# Altium integrated library Blues Wireless Library.IntLib: 99 symbols (part 2 of 2)
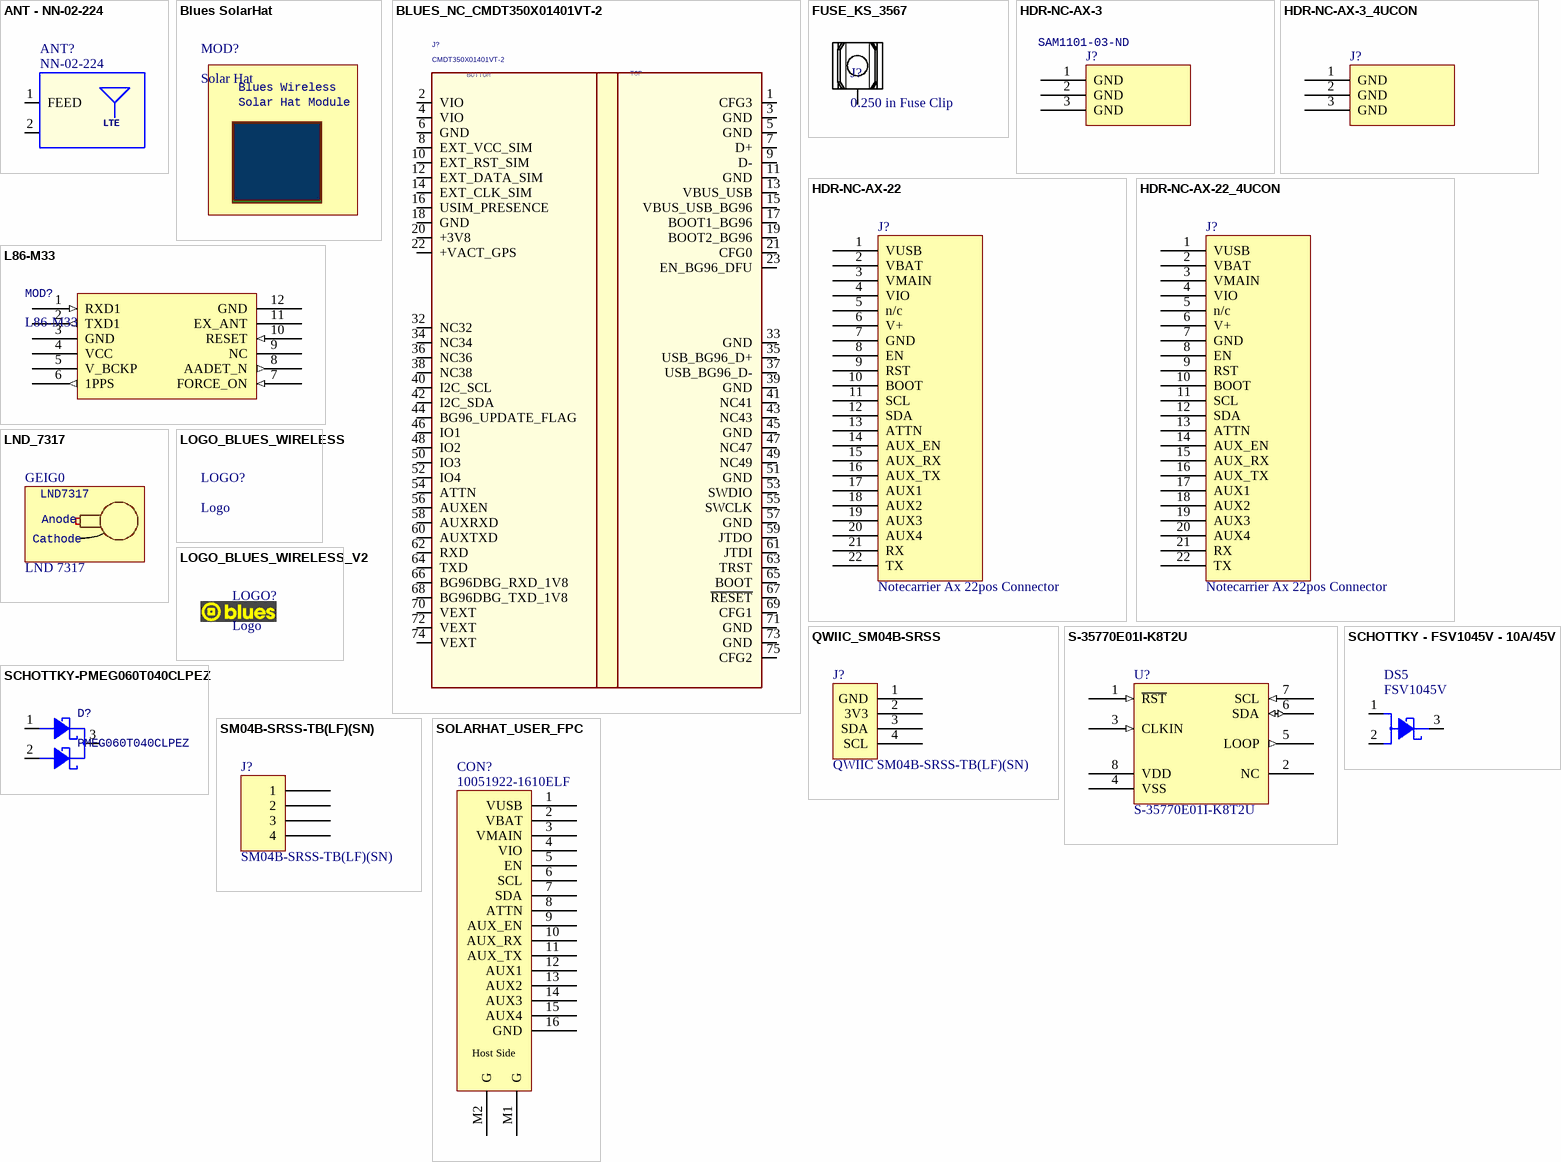
[diagram p8: symbols ANT - NN-02-224 to SOLARHAT_USER_FPC]

## BLUES_NC_CMDT350X01401VT-2
designator J?, comment CMDT350X01401VT-2
CONN. M.2 75P M P=0.5 CMDT350X01401VT-2 AMPHENOL SMT, Pinned for Blues Inc Notecard; Database: 44633; Famiglia: CONNETTORE; Pkg Type: SMD; Temp Range: -40°..+80°; Caratteristiche: 75P; Distributor: FAE; Price Distributor Cad: 1,079
footprint AMP_CMDT350E01401VT-2 (Vertical M.2 Mini PCIe Gen4 Connector, Key E)
footprint BLUES_NC_CMDT350X01401VT-2 (Blues Inc Notecard Slot - Vertical M.2 Mini PCIe Gen4 Connector, Key E)
pins: 1 CFG3, 2 VIO (power), 3 GND (power), 4 VIO (power), 5 GND (power), 6 GND (power), 7 D+, 8 EXT_VCC_SIM, 9 D-, 10 EXT_RST_SIM, 11 GND (power), 12 EXT_DATA_SIM, 13 VBUS_USB (power), 14 EXT_CLK_SIM, 15 VBUS_USB_BG96, 16 USIM_PRESENCE, 17 BOOT1_BG96, 18 GND (power), 19 BOOT2_BG96, 20 +3V8 (power), 21 CFG0, 22 +VACT_GPS, 23 EN_BG96_DFU, 32 NC32, 33 GND (power), 34 NC34, 35 USB_BG96_D+, 36 NC36, 37 USB_BG96_D-, 38 NC38, 39 GND (power), 40 I2C_SCL, 41 NC41, 42 I2C_SDA, 43 NC43, 44 BG96_UPDATE_FLAG, 45 GND (power), 46 IO1, 47 NC47, 48 IO2, 49 NC49, 50 IO3, 51 GND (power), 52 IO4, 53 SWDIO, 54 ATTN, 55 SWCLK, 56 AUXEN, 57 GND (power), 58 AUXRXD, 59 JTDO, 60 AUXTXD, 61 JTDI, 62 RXD, 63 TRST, 64 TXD, 65 BOOT, 66 BG96DBG_RXD_1V8, 67 ~{RESET}, 68 BG96DBG_TXD_1V8, 69 CFG1, 70 VEXT (power), 71 GND (power), 72 VEXT (power), 73 GND (power), 74 VEXT (power), 75 CFG2
text: BOTTOM; TOP

## FUSE_KS_3567
designator J?, comment 0.250 in Fuse Clip
Fuse Clip 0.250 in. SMD, Keystone 3567
footprint FUSE_KS_3567 (Fuse Holder, 1/4 inch, SMD. Keystone 3567)
pins: 1 "Position 1"

## HDR-NC-AX-3
designator J?, comment Notecarrier Ax 3pos Connector  Supplier Part Number 1: SAM1101-03-ND
Header, 3 pos. For connection to Notecarrier Ax.; Number of Contacts: 22; Number of Positions: 3; Gender: Male; Connector Type: Male Pin; Pitch: 0.1inch; Function 1: Function 1; Function 2: Function 2; Manufacturer 2: Samtec; Manufacturer Part Number 2: TLW-103-06-T-S; RoHS: Yes; Category: Connectors; Pricing 2: 1=2.62000, 10=2.51900, 25=2.30880, 50=2.20380, 100=2.09880, 250=1.83644, 500=1.78398 (USD); Mount: Through Hole; Contact Plating: Tin; Color: Black; Housing Color: Black; Contact Material: Bronze; Housing Material: Plastic; Number of Rows: 1; Termination: Solder; Packaging: Bulk; Package Quantity: 1; Series: Flex Stack, TLW; Contact Type: Male Pin; Length: 55.9mm; Width: 2.45mm; Height: 1.52mm; Contact Mating Length: 0.105inch; Radiation Hardening: No; Lead Free: Lead Free; RoHS Compliant: Yes; ComponentLink1URL: https://datasheet.ciiva.com/6882/tlw-mkt-6882597.pdf?src-supplier=Digi-Key; ComponentLink1Description: https://datasheet.ciiva.com/6882/tlw-mkt-6882597.pdf?src-supplier=Digi-Key; Supplier 1: Digi-Key
footprint HDR-NC-AX-3 (Header, 3pos, to Notecarrier AX)
pins: 1 GND "Pin 1", 2 GND "Pin 1", 3 GND "Pin 1"

## HDR-NC-AX-3_4UCON
designator J?, comment Notecarrier Ax 3pos Connector
Header, 3 pos. For connection to Notecarrier Ax.; Manufacturer: 4UCON; Manufacturer Part Number: 00626; Connector Type: Male Pin; Function 1: Function 1; Function 2: Function 2; ComponentLink1Description: Supplier Page; ComponentLink1URL: http://www.4uconnector.com/online/object/4udrawing/00626.pdf; Category: Connectors; Height: 2.5mm; Supplier 1: 4UCON; Supplier Part Number 1: 00626
footprint HDR-NC-AX-3_4UCON (Header, 3pos, to Notecarrier AX, 2.5 mm body)
pins: 1 GND "Pin 1", 2 GND "Pin 1", 3 GND "Pin 1"

## HDR-NC-AX-22
designator J?, comment Notecarrier Ax 22pos Connector
Header, 22 pos. For connection to Notecarrier Ax.; Number of Contacts: 22; Gender: Male; Connector Type: Male Pin; Pitch: 0.1inch; Function 1: Function 1; Function 2: Function 2; Supplier 1: Newark; Supplier 2: Digi-Key; Manufacturer 2: Samtec; Manufacturer Part Number 2: TLW-122-06-T-S; RoHS: Yes; Category: Connectors; Pricing 2: 1=2.62000, 10=2.51900, 25=2.30880, 50=2.20380, 100=2.09880, 250=1.83644, 500=1.78398 (USD); Mount: Through Hole; Contact Plating: Tin; Color: Black; Housing Color: Black; Contact Material: Bronze; Housing Material: Plastic; Number of Rows: 1; Termination: Solder; Packaging: Bulk; Package Quantity: 1; Number of Positions: 22; Series: Flex Stack, TLW; Contact Type: Male Pin; Length: 55.9mm; Width: 2.45mm; Height: 1.52mm; Contact Mating Length: 0.105inch; Radiation Hardening: No; Lead Free: Lead Free; RoHS Compliant: Yes; ComponentLink1URL: https://datasheet.ciiva.com/6882/tlw-mkt-6882597.pdf?src-supplier=Digi-Key; ComponentLink1Description: https://datasheet.ciiva.com/6882/tlw-mkt-6882597.pdf?src-supplier=Digi-Key; Supplier Part Number 2: SAM1101-22-ND; Supplier Part Number 1: 12P0533
footprint HDR-NC-AX-22 (Header, 22 pos, to Notecarrier AX)
pins: 1 VUSB "Pin 1", 2 VBAT "Pin 1", 3 VMAIN "Pin 1", 4 VIO "Pin 1", 5 n/c "Pin 1", 6 V+ "Pin 1", 7 GND "Pin 1", 8 EN "Pin 1", 9 RST "Pin 1", 10 BOOT "Pin 1", 11 SCL "Pin 1", 12 SDA "Pin 1", 13 ATTN "Pin 1", 14 AUX_EN "Pin 1", 15 AUX_RX "Pin 1", 16 AUX_TX "Pin 1", 17 AUX1 "Pin 1", 18 AUX2 "Pin 1", 19 AUX3 "Pin 1", 20 AUX4 "Pin 1", 21 RX "Pin 1", 22 TX "Pin 1"

## HDR-NC-AX-22_4UCON
designator J?, comment Notecarrier Ax 22pos Connector
Header, 22 pos. For connection to Notecarrier Ax.; Manufacturer: 4UCON; Manufacturer Part Number: 22042; Connector Type: Male Pin; Function 1: Function 1; Function 2: Function 2; Category: Connectors; ComponentLink1Description: Datasheet; ComponentLink1URL: http://www.4uconnector.com/online/object/4udrawing/22042.pdf; Height: 2.5mm; Supplier 1: 4UCON; Supplier Part Number 1: 22042
footprint HDR-NC-AX-22_4UCON (Header, 22 pos, to Notecarrier AX, 2.5mm body)
pins: 1 VUSB "Pin 1", 2 VBAT "Pin 1", 3 VMAIN "Pin 1", 4 VIO "Pin 1", 5 n/c "Pin 1", 6 V+ "Pin 1", 7 GND "Pin 1", 8 EN "Pin 1", 9 RST "Pin 1", 10 BOOT "Pin 1", 11 SCL "Pin 1", 12 SDA "Pin 1", 13 ATTN "Pin 1", 14 AUX_EN "Pin 1", 15 AUX_RX "Pin 1", 16 AUX_TX "Pin 1", 17 AUX1 "Pin 1", 18 AUX2 "Pin 1", 19 AUX3 "Pin 1", 20 AUX4 "Pin 1", 21 RX "Pin 1", 22 TX "Pin 1"

## L86-M33
designator MOD?
Global Navigation Satellite System Module with Patch Antenna. Quectel L86-M33; Manufacturer 1: Quectel Wireless Solutions; Supplier 1: Digi-Key; Manufacturer Part Number 1: L86-M33; RoHS: Yes; Category: Connectors; Pricing 1: 1=12.70000, 10=11.49500, 25=10.58760, 100=9.68000 (USD); ComponentLink1URL: http://www.quectel.com/UploadFile/Product/Quectel_L86_GNSS_Specification_V1.0.pdf?src-supplier=Avnet; ComponentLink1Description: http://www.quectel.com/UploadFile/Product/Quectel_L86_GNSS_Specification_V1.0.pdf?src-supplier=Avnet; Supplier Part Number 1: 2958-L86-M33CT-ND
footprint Quectel L86 (Quectel L86 Module)
pins: 1 RXD1 (in), 2 TXD1 (out), 3 GND, 4 VCC, 5 V_BCKP, 6 1PPS (out), 7 FORCE_ON (in), 8 AADET_N (out), 9 NC, 10 RESET (in), 11 EX_ANT, 12 GND

## LND_7317
designator GEIG0, comment LND 7317  (mechanical)
LND 7317 Pancake Geiger Mueller Tube; Manufacturer Part Number: 7317; Lot qty: 1; ComponentLink1Description: Product Page; ComponentLink1URL: http://www.lndinc.com/products/17/; Manufacturer: LND; Supplier 1: LND; Supplier Part Number 1: 7317
footprint lnd7317 (LND7317 GM Tube)
text: LND7317; Anode; Cathode

## LOGO_BLUES_WIRELESS
designator LOGO?, comment Logo  (graphical)
Logo, Blues Wireless
footprint LOGO_BLUES_WIRELESS (Logo Silkscreen)

## LOGO_BLUES_WIRELESS_V2
designator LOGO?, comment Logo  (graphical)
Logo, Blues Wireless
footprint LOGO_BLUES_WIRELESS_v2 (Blues Wireless Box-in-circle Logo)

## QWIIC_SM04B-SRSS
designator J?, comment QWIIC SM04B-SRSS-TB(LF)(SN)
CONN HEADER SH 4POS SIDE 1MM TIN QWIIC pinout; Manufacturer: JST; Number of Positions: 4; Connector Type: Male Pin; Contact Resistance: 40mR; Max Current Rating: 1A; Max Voltage Rating (AC): 50V; Pitch: 0.039inch; Supplier 1: Digi-Key; Manufacturer Part Number: SM04B-SRSS-TB(LF)(SN); RoHS: Yes; Category: Connectors; Pricing 1: 1=0.57000, 10=0.49300, 100=0.40630, 500=0.35328, 1000=0.29146 (USD); Mount: Surface Mount; Contact Material: Copper Alloy; Contact Plating: Tin,Copper; Color: Natural; Housing Color: Beige; Housing Material: Polyamide; Min Operating Temperature: -25°C; Max Operating Temperature: 85°C; Number of Rows: 1; Termination: Solder; Packaging: Tape and Reel; Orientation: Right Angle; Number of Contacts: 4; Max Voltage Rating (DC): 50V; Length: 6mm; Depth: 4.95mm; Lead Free: Lead Free; ComponentLink1URL: https://datasheet.ciiva.com/26894/getdatasheetpartid-640736-26894676.pdf?src-supplier=Verical; ComponentLink1Description: https://datasheet.ciiva.com/26894/getdatasheetpartid-640736-26894676.pdf?src-supplier=Verical; ComponentLink2URL: https://datasheet.ciiva.com/26894/getdatasheetpartid-499363-26894945.pdf?src-supplier=Verical; ComponentLink2Description: https://datasheet.ciiva.com/26894/getdatasheetpartid-499363-26894945.pdf?src-supplier=Verical; ComponentLink3URL: https://datasheet.ciiva.com/16487/jstsm04b-srss-tb-lf-sn-16487222.pdf?src-supplier=Future+Electronics; ComponentLink3Description: https://datasheet.ciiva.com/16487/jstsm04b-srss-tb-lf-sn-16487222.pdf?src-supplier=Future+Electronics; Supplier Part Number 1: 455-1804-1-ND
footprint QWIIC_SM04B-SRSS (QWIIC Connector Pin Order)
pins: 1 GND, 2 3V3, 3 SDA, 4 SCL

## S-35770E01I-K8T2U
designator U?
COUNTER IC WITH 2-WIRE (I2C-bus) INTERFACE, ABLIC S-35770; Manufacturer 1: ABLIC U.S.A.; Supplier 1: Digi-Key; Manufacturer Part Number 1: S-35770E01I-K8T2U; RoHS: No; Stock 1: 3157; Pricing 1: 1=5.86000, 10=5.26300, 25=4.97520, 100=4.31180, 250=4.09064, 500=3.67052, 1000=3.09562 (USD); Supplier Part Number 1: 1662-3409-1-ND; ComponentLink1Description: Datasheet; ComponentLink1URL: https://www.ablic.com/en/doc/datasheet/counter_ic/S35770_I_E.pdf
footprint TSOP65P400X80-8N (TSOP, 8-Leads, Body 2.90x2.80mm, Pitch 0.65mm, IPC Medium Density)
pins: 1 ~{RST} (in) "Reset signal (needs pullup)", 2 NC "No connection", 3 CLKIN (in) "Input pin for external clock", 4 VSS (power) "Ground", 5 LOOP (out) "Counter loop flag", 6 SDA (io) "N-ch open-drain output,", 7 SCL (in) "Serial clock", 8 VDD (power) "Positive power supply"

## SCHOTTKY - FSV1045V - 10A/45V
designator DS5, comment FSV1045V
DIODO SCHOTTKY 10A 45V FSV1045V TO277-3 SMT; Caratteristiche: 10A/45V; Database: 42269; Pkg Type: SMD; Temp Range: -55°..+150°; Distributor: FAE; Famiglia: DIODO; Modello: SCHOTTKY; Price Distributor Cad: 0,629; MPN: FSV1045V; PCB Footprint: TO277-3
footprint TO277-3
pins: 1 A1, 2 A2, 3 C

## SCHOTTKY-PMEG060T040CLPEZ
designator D?, comment PMEG060T040CLPEZ
60 V, 2 x 2 A dual common cathode low leakage current Schottky rectifier; Manufacturer: Nexperia; Supplier 1: Newark; Manufacturer Part Number: PMEG060T040CLPEZ; RoHS: No; Stock 1: 4997; Pricing 1: 1=0.71300, 10=0.58300, 25=0.51500, 50=0.45900, 100=0.39300, 250=0.34500, 500=0.27300, 1000=0.26300 (USD); Supplier 2: Digi-Key; Stock 2: 4917; Pricing 2: 1=0.65000, 10=0.56900, 100=0.43660, 500=0.34514, 1000=0.27611, 2000=0.25023 (USD); Supplier Part Number 2: 1727-PMEG060T040CLPEZCT-ND
footprint NXP_CFP15B (Nexperia CFP15B (SOT1289B))
pins: 1 A1, 2 A2, 3 C

## SM04B-SRSS-TB(LF)(SN)
designator J?
CONN HEADER SH 4POS SIDE 1MM TIN; Manufacturer: JST; Number of Positions: 4; Connector Type: Male Pin; Contact Resistance: 40mR; Max Current Rating: 1A; Max Voltage Rating (AC): 50V; Pitch: 0.039inch; Supplier 1: Digi-Key; Manufacturer Part Number: SM04B-SRSS-TB(LF)(SN); RoHS: Yes; Category: Connectors; Pricing 1: 1=0.57000, 10=0.49300, 100=0.40630, 500=0.35328, 1000=0.29146 (USD); Mount: Surface Mount; Contact Material: Copper Alloy; Contact Plating: Tin,Copper; Color: Natural; Housing Color: Beige; Housing Material: Polyamide; Min Operating Temperature: -25°C; Max Operating Temperature: 85°C; Number of Rows: 1; Termination: Solder; Packaging: Tape and Reel; Orientation: Right Angle; Number of Contacts: 4; Max Voltage Rating (DC): 50V; Length: 6mm; Depth: 4.95mm; Lead Free: Lead Free; ComponentLink1URL: https://datasheet.ciiva.com/26894/getdatasheetpartid-640736-26894676.pdf?src-supplier=Verical; ComponentLink1Description: https://datasheet.ciiva.com/26894/getdatasheetpartid-640736-26894676.pdf?src-supplier=Verical; ComponentLink2URL: https://datasheet.ciiva.com/26894/getdatasheetpartid-499363-26894945.pdf?src-supplier=Verical; ComponentLink2Description: https://datasheet.ciiva.com/26894/getdatasheetpartid-499363-26894945.pdf?src-supplier=Verical; ComponentLink3URL: https://datasheet.ciiva.com/16487/jstsm04b-srss-tb-lf-sn-16487222.pdf?src-supplier=Future+Electronics; ComponentLink3Description: https://datasheet.ciiva.com/16487/jstsm04b-srss-tb-lf-sn-16487222.pdf?src-supplier=Future+Electronics; Supplier Part Number 1: 455-1804-1-ND
footprint JST SM04B-SRSS-TB
pins: 1, 2, 3, 4

## SOLARHAT_USER_FPC
designator CON?, comment 10051922-1610ELF
Solarhat User Side FPC Connector - 16POS 0.50MM R/A, AMP 10051922-1610ELF; MFR: Amphenol ICC (FCI); Manufacturer: Amphenol FCI; D: CONN FPC BOTTOM 16POS 0.50MM R/A; Description 1: Conn FPC Connector SKT 16 POS 0.5mm Solder RA SMD T/R; Actuator Material: Nylon,Glass,Polyamide; Number of Contacts: 16; Contact Resistance: 30mR; Voltage Rating: 50V; Current Rating: 500mA; Contact Location: Bottom; Insulation Resistance: 100MR; Pitch: 0.5mm; PN: 10051922-1610ELF; Supplier 1: Digi-Key; Supplier Part Number 1: 609-5374-1-ND; Manufacturer Part Number: 10051922-1610ELF; RoHS: Yes; Category: FFC / FPC; Stock 1: 802; Pricing 1: 1=0.73000, 10=0.63800, 25=0.60080, 50=0.57560, 100=0.55060, 250=0.50052, 500=0.45046, 1000=0.40040 (USD); Mount: Surface Mount; Contact Material: Bronze,Copper Alloy; Contact Plating: Gold; Housing Color: Natural; Housing Material: Polymer; Min Operating Temperature: -55°C; Max Operating Temperature: 85°C; Number of Rows: 1; Orientation: Right Angle; Termination: Solder; Packaging: Tape and Reel; Package Quantity: 4500; Number of Positions: 16; Max Voltage Rating (AC): 50V; Max Voltage Rating (DC): 50V; Length: 10.5mm; Depth: 3.4mm; Radiation Hardening: No; Flammability Rating: UL94 V-0; ComponentLink1URL: https://datasheet.ciiva.com/10369/10051922-10369223.pdf?src-supplier=Avnet; ComponentLink1Description: https://datasheet.ciiva.com/10369/10051922-10369223.pdf?src-supplier=Avnet; ComponentLink2URL: https://datasheet.ciiva.com/18492/10051922-18492028.pdf?src-supplier=Digi-Key; ComponentLink2Description: https://datasheet.ciiva.com/18492/10051922-18492028.pdf?src-supplier=Digi-Key
footprint 10051922-1610ELF_REVERSED (CONN FPC BOTTOM 16POS 0.50MM R/A)
pins: 1 VUSB, 2 VBAT, 3 VMAIN, 4 VIO, 5 EN, 6 SCL, 7 SDA, 8 ATTN, 9 AUX_EN, 10 AUX_RX, 11 AUX_TX, 12 AUX1, 13 AUX2, 14 AUX3, 15 AUX4, 16 GND, M1 G, M2 G
text: Host Side


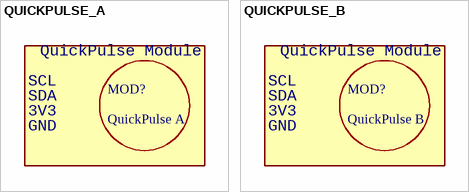
[diagram p7: symbols QUICKPULSE_A to QUICKPULSE_B]

## QUICKPULSE_A
designator MOD?, comment QuickPulse A
footprint QUICKPULSE_A (QuickPulse A)
text: QuickPulse Module; SCL; SDA; 3V3; GND

## QUICKPULSE_B
designator MOD?, comment QuickPulse B
footprint QUICKPULSE_B (QuickPulse B)
text: QuickPulse Module; SCL; SDA; 3V3; GND